# Altium footprint library Connectors.PcbLib: 43 footprints (part 2 of 3)
Each footprint in its own frame and in the unit in brackets; x right, y up, seen from the top. Pads: shape width x height; smd on the part's side, far side on the other; paste and mask are expansions set on the pad; w line width, h text height; cw(c..) or ccw(c..) is an arc to the next point about the centre after c.
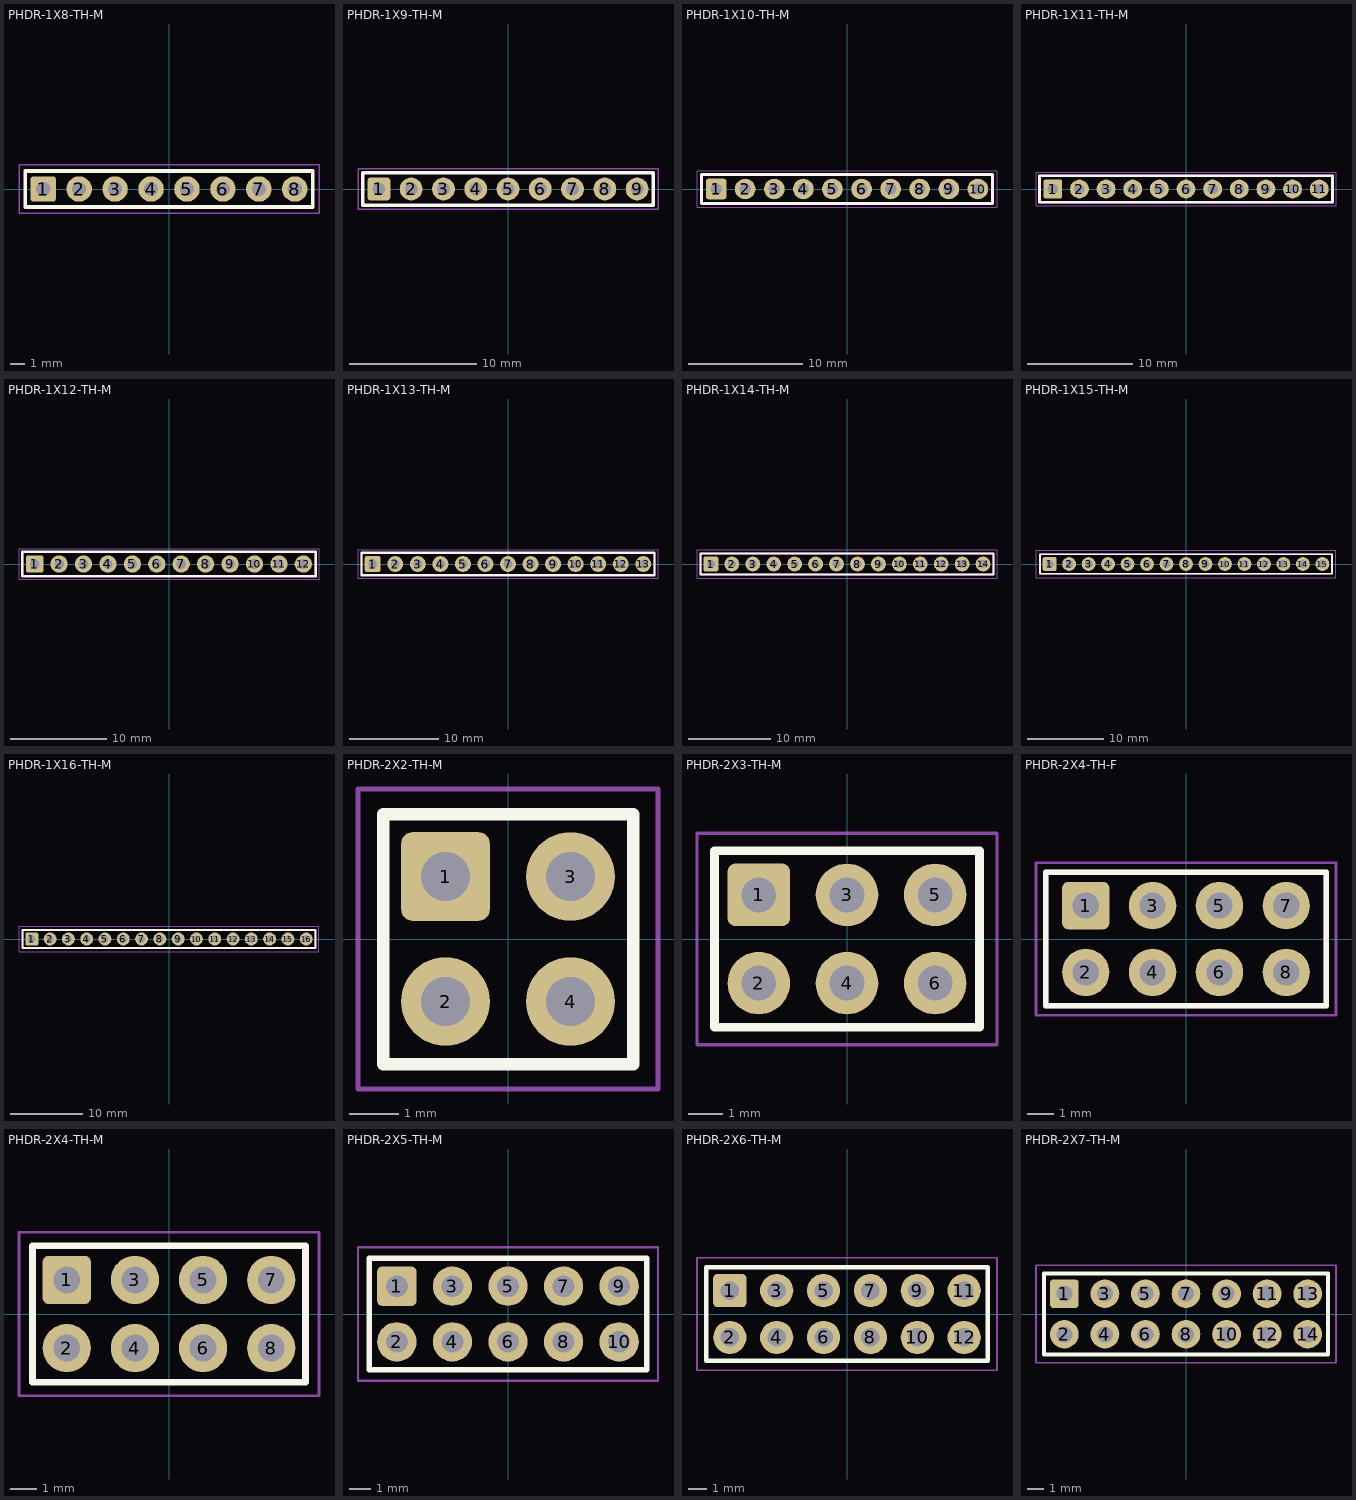
[diagram p1: the footprints below, top view; thin cyan lines are the x and y axes]

## PHDR-1X8-TH-M [mm] "Pin Header 1x8 Male TH Pitch 2.54mm"
height 9.5
pads (8):
  rrect25% 1.8x1.8 hole 1: 1(-8.89,0)
  round 1.8 hole 1: 2(-6.35,0) 3(-3.81,0) 4(-1.27,0) 5(1.27,0) 6(3.81,0) 7(6.35,0) 8(8.89,0)
Top Overlay:
  lines w0.254: -7.62,1.27 -10.16,1.27 ; -10.16,1.27 -10.16,-1.27 10.16,-1.27 10.16,1.27 -10.16,1.27
Top Assembly:
  circle w0.5: c-8.89,0 r0.15
  lines w0.2: -10.16,-1.27 10.16,-1.27 10.16,1.27 -10.16,1.27 -10.16,-1.27
Top Courtyard:
  lines w0.1: -10.6,-1.7 10.6,-1.7 10.6,1.7 -10.6,1.7 -10.6,-1.7
Top Designator:
  text ".Designator" at -7.498,-0.5 h1.5
3D body "Pin Header 1x8 TH Pitch 2.54mm.stp": height 9.5, standoff -3.2, extent -10.16,-1.27 10.16,1.27

## PHDR-1X9-TH-M [mm] "Pin Header 1x9 Male TH Pitch 2.54mm"
height 9.5
pads (9):
  rrect25% 1.8x1.8 hole 1: 1(-10.16,0)
  round 1.8 hole 1: 2(-7.62,0) 3(-5.08,0) 4(-2.54,0) 5(0,0) 6(2.54,0) 7(5.08,0) 8(7.62,0) 9(10.16,0)
Top Overlay:
  lines w0.254: -8.89,1.27 -11.43,1.27 ; -11.43,1.27 -11.43,-1.27 11.43,-1.27 11.43,1.27 -11.43,1.27
Top Assembly:
  circle w0.5: c-10.16,0 r0.15
  lines w0.2: -11.43,-1.27 -11.43,1.27 11.43,1.27 11.43,-1.27 -11.43,-1.27
Top Courtyard:
  lines w0.1: -11.8,-1.6 -11.8,1.6 11.8,1.6 11.8,-1.6 -11.8,-1.6
Top Designator:
  text ".Designator" at -7.498,-0.5 h1.5
3D body "Pin Header 1x9 TH Pitch 2.54mm.stp": height 9.5, standoff -3.2, extent -11.43,-1.27 11.43,1.27

## PHDR-1X10-TH-M [mm] "Pin Header 1x10 Male TH Pitch 2.54mm"
height 9.5
pads (10):
  rrect25% 1.8x1.8 hole 1: 1(-11.43,0)
  round 1.8 hole 1: 2(-8.89,0) 3(-6.35,0) 4(-3.81,0) 5(-1.27,0) 6(1.27,0) 7(3.81,0) 8(6.35,0) 9(8.89,0) 10(11.43,0)
Top Overlay:
  lines w0.254: -10.16,1.27 -12.7,1.27 ; -12.7,1.27 -12.7,-1.27 12.7,-1.27 12.7,1.27 -12.7,1.27
Top Assembly:
  circle w0.5: c-11.43,0 r0.15
  lines w0.2: -12.7,-1.27 12.7,-1.27 12.7,1.27 -12.7,1.27 -12.7,-1.27
Top Courtyard:
  lines w0.1: -13.1,-1.6 -13.1,1.6 13.1,1.6 13.1,-1.6 -13.1,-1.6
Top Designator:
  text ".Designator" at -7.498,-0.5 h1.5
3D body "Pin Header 1x10 TH Pitch 2.54mm.stp": height 9.5, standoff -3.2, extent -12.7,-1.27 12.7,1.27

## PHDR-1X11-TH-M [mm] "Pin Header 1x11 Male TH Pitch 2.54mm"
height 9.5
pads (11):
  rrect25% 1.8x1.8 hole 1: 1(-12.7,0)
  round 1.8 hole 1: 2(-10.16,0) 3(-7.62,0) 4(-5.08,0) 5(-2.54,0) 6(0,0) 7(2.54,0) 8(5.08,0) 9(7.62,0) 10(10.16,0) 11(12.7,0)
Top Overlay:
  lines w0.254: -11.43,1.27 -13.97,1.27 ; -13.97,1.27 13.97,1.27 13.97,-1.27 -13.97,-1.27 -13.97,1.27
Top Assembly:
  circle w0.5: c-12.7,0 r0.15
  lines w0.2: -13.97,-1.27 -13.97,1.27 13.97,1.27 13.97,-1.27 -13.97,-1.27
Top Courtyard:
  lines w0.1: -14.3,-1.6 14.3,-1.6 14.3,1.6 -14.3,1.6 -14.3,-1.6
Top Designator:
  text ".Designator" at -7.498,-0.5 h1.5
3D body "Pin Header 1x11 TH Pitch 2.54mm.stp": height 9.5, standoff -3.2, extent -13.97,-1.27 13.97,1.27

## PHDR-1X12-TH-M [mm] "Pin Header 1x12 Male TH Pitch 2.54mm"
height 9.5
pads (12):
  rrect25% 1.8x1.8 hole 1: 1(-13.97,0)
  round 1.8 hole 1: 2(-11.43,0) 3(-8.89,0) 4(-6.35,0) 5(-3.81,0) 6(-1.27,0) 7(1.27,0) 8(3.81,0) 9(6.35,0) 10(8.89,0) 11(11.43,0) 12(13.97,0)
Top Overlay:
  lines w0.254: -12.7,1.27 -15.24,1.27 ; -15.24,1.27 15.24,1.27 15.24,-1.27 -15.24,-1.27 -15.24,1.27
Top Assembly:
  circle w0.5: c-13.97,0 r0.15
  lines w0.2: -15.24,-1.27 15.24,-1.27 15.24,1.27 -15.24,1.27 -15.24,-1.27
Top Courtyard:
  lines w0.1: -15.6,-1.6 15.6,-1.6 15.6,1.6 -15.6,1.6 -15.6,-1.6
Top Designator:
  text ".Designator" at -7.498,-0.5 h1.5
3D body "Pin Header 1x12 TH Pitch 2.54mm.stp": height 9.5, standoff -3.2, extent -15.24,-1.27 15.24,1.27

## PHDR-1X13-TH-M [mm] "Pin Header 1x13 Male TH Pitch 2.54mm"
height 9.5
pads (13):
  rrect25% 1.8x1.8 hole 1: 1(-15.24,0)
  round 1.8 hole 1: 2(-12.7,0) 3(-10.16,0) 4(-7.62,0) 5(-5.08,0) 6(-2.54,0) 7(0,0) 8(2.54,0) 9(5.08,0) 10(7.62,0) 11(10.16,0) 12(12.7,0) 13(15.24,0)
Top Overlay:
  lines w0.254: -13.97,1.27 -16.51,1.27 ; -16.51,1.27 16.51,1.27 16.51,-1.27 -16.51,-1.27 -16.51,1.27
Top Assembly:
  circle w0.5: c-15.24,0 r0.15
  lines w0.2: -16.51,-1.27 16.51,-1.27 16.51,1.27 -16.51,1.27 -16.51,-1.27
Top Courtyard:
  lines w0.1: -16.9,-1.6 -16.9,1.6 16.9,1.6 16.9,-1.6 -16.9,-1.6
Top Designator:
  text ".Designator" at -7.498,-0.5 h1.5
3D body "Pin Header 1x13 TH Pitch 2.54mm.stp": height 9.5, standoff -3.2, extent -16.51,-1.27 16.51,1.27

## PHDR-1X14-TH-M [mm] "Pin Header 1x14 Male TH Pitch 2.54mm"
height 9.5
pads (14):
  rrect25% 1.8x1.8 hole 1: 1(-16.51,0)
  round 1.8 hole 1: 2(-13.97,0) 3(-11.43,0) 4(-8.89,0) 5(-6.35,0) 6(-3.81,0) 7(-1.27,0) 8(1.27,0) 9(3.81,0) 10(6.35,0) 11(8.89,0) 12(11.43,0) 13(13.97,0) 14(16.51,0)
Top Overlay:
  lines w0.254: -15.24,1.27 -17.78,1.27 ; -17.78,1.27 -17.78,-1.27 17.78,-1.27 17.78,1.27 -17.78,1.27
Top Assembly:
  circle w0.5: c-16.51,0 r0.15
  lines w0.2: -17.78,-1.27 -17.78,1.27 17.78,1.27 17.78,-1.27 -17.78,-1.27
Top Courtyard:
  lines w0.1: -18.2,-1.7 -18.2,1.7 18.2,1.7 18.2,-1.7 -18.2,-1.7
Top Designator:
  text ".Designator" at -7.498,-0.5 h1.5
3D body "Pin Header 1x14 TH Pitch 2.54mm.stp": height 9.5, standoff -3.2, extent -17.78,-1.27 17.78,1.27

## PHDR-1X15-TH-M [mm] "Pin Header 1x15 Male TH Pitch 2.54mm"
height 9.5
pads (15):
  rrect25% 1.8x1.8 hole 1: 1(-17.78,0)
  round 1.8 hole 1: 2(-15.24,0) 3(-12.7,0) 4(-10.16,0) 5(-7.62,0) 6(-5.08,0) 7(-2.54,0) 8(0,0) 9(2.54,0) 10(5.08,0) 11(7.62,0) 12(10.16,0) 13(12.7,0) 14(15.24,0) 15(17.78,0)
Top Overlay:
  lines w0.254: -16.51,1.27 -19.05,1.27 ; -19.05,1.27 -19.05,-1.27 19.05,-1.27 19.05,1.27 -19.05,1.27
Top Assembly:
  circle w0.5: c-17.78,0 r0.15
  lines w0.2: -19.05,-1.27 -19.05,1.27 19.05,1.27 19.05,-1.27 -19.05,-1.27
Top Courtyard:
  lines w0.1: -19.558,-1.778 -19.558,1.778 19.558,1.778 19.558,-1.778 -19.558,-1.778
Top Designator:
  text ".Designator" at -7.498,-0.5 h1.5
3D body "Pin Header 1x15 TH Pitch 2.54mm.stp": height 9.5, standoff -3.2, extent -19.05,-1.27 19.05,1.27

## PHDR-1X16-TH-M [mm] "Pin Header 1x16 Male TH Pitch 2.54mm"
height 9.5
pads (16):
  rrect25% 1.8x1.8 hole 1: 1(-19.05,0)
  round 1.8 hole 1: 2(-16.51,0) 3(-13.97,0) 4(-11.43,0) 5(-8.89,0) 6(-6.35,0) 7(-3.81,0) 8(-1.27,0) 9(1.27,0) 10(3.81,0) 11(6.35,0) 12(8.89,0) 13(11.43,0) 14(13.97,0) 15(16.51,0) 16(19.05,0)
Top Overlay:
  lines w0.254: -17.78,1.27 -20.32,1.27 ; -20.32,1.27 -20.32,-1.27 20.32,-1.27 20.32,1.27 -20.32,1.27
Top Assembly:
  circle w0.5: c-19.05,0 r0.15
  lines w0.2: -20.32,-1.27 20.32,-1.27 20.32,1.27 -20.32,1.27 -20.32,-1.27
Top Courtyard:
  lines w0.1: -20.828,-1.778 -20.828,1.778 20.828,1.778 20.828,-1.778 -20.828,-1.778
Top Designator:
  text ".Designator" at -7.498,-0.5 h1.5
3D body "Pin Header 1x16 TH Pitch 2.54mm.stp": height 9.5, standoff -3.2, extent -20.32,-1.27 20.32,1.27

## PHDR-2X2-TH-M [mm] "PinHeader 2x2 TH Pitch 2.54mm"
height 9.5
pads (4):
  rrect25% 1.8x1.8 hole 1: 1(-1.27,1.27)
  round 1.8 hole 1: 2(-1.27,-1.27) 3(1.27,1.27) 4(1.27,-1.27)
Top Overlay:
  lines w0.254: 0,2.54 -2.54,2.54 ; -2.54,2.54 -2.54,0 -2.54,-2.54 2.54,-2.54 2.54,2.54 -2.54,2.54
Top Assembly:
  circle w0.5: c-1.27,1.27 r0.15
  lines w0.2: -2.54,-2.54 -2.54,2.54 2.54,2.54 2.54,-2.54 -2.54,-2.54
Top Courtyard:
  lines w0.1: -3.048,-3.048 3.048,-3.048 3.048,3.048 -3.048,3.048 -3.048,-3.048
Top Designator:
  text ".Designator" at -7.498,-0.5 h1.5
3D body "Pin Header 2x2 TH Pitch 2.54mm.stp": height 9.5, standoff -3.2, extent -2.54,-2.54 2.54,2.54

## PHDR-2X3-TH-M [mm] "PinHeader 2x3 TH Pitch 2.54mm"
height 9.5
pads (6):
  rrect25% 1.8x1.8 hole 1: 1(-2.54,1.27)
  round 1.8 hole 1: 2(-2.54,-1.27) 3(0,1.27) 4(0,-1.27) 5(2.54,1.27) 6(2.54,-1.27)
Top Overlay:
  lines w0.254: -1.27,2.54 -3.81,2.54 ; -3.81,2.54 3.81,2.54 3.81,-2.54 -3.81,-2.54 -3.81,0 -3.81,2.54
Top Assembly:
  circle w0.5: c-2.54,1.27 r0.15
  lines w0.2: -3.81,-2.54 -3.81,2.54 3.81,2.54 3.81,-2.54 -3.81,-2.54
Top Courtyard:
  lines w0.1: -4.318,-3.048 4.318,-3.048 4.318,3.048 -4.318,3.048 -4.318,-3.048
Top Designator:
  text ".Designator" at -7.498,-0.5 h1.5
3D body "Pin Header 2x3 TH Pitch 2.54mm.stp": height 9.5, standoff -3.2, extent -3.81,-2.54 3.81,2.54

## PHDR-2X4-TH-F [mm] "PinHeader female 2x4 TH Pitch 2.54mm"
height 9.5
pads (8):
  rrect25% 1.8x1.8 hole 1: 1(-3.81,1.27)
  round 1.8 hole 1: 2(-3.81,-1.27) 3(-1.27,1.27) 4(-1.27,-1.27) 5(1.27,1.27) 6(1.27,-1.27) 7(3.81,1.27) 8(3.81,-1.27)
Top Overlay:
  lines w0.2: -5.33,-2.54 -5.33,2.54 5.334,2.54 5.334,-2.54 -5.33,-2.54
Top Assembly:
  circle w0.5: c-3.81,1.27 r0.15
  lines w0.2: -5.33,-2.54 -5.33,2.54 5.334,2.54 5.334,-2.54 -5.33,-2.54
Top Courtyard:
  lines w0.1: -5.7,-2.9 -5.7,2.9 5.7,2.9 5.7,-2.9 -5.7,-2.9
Top Designator:
  text ".Designator" at -7.498,-0.5 h1.5
3D body "User Library-zl262-8d_p2-54_l10-66_w5_h8-5.step": height 8.5, standoff -3, extent -5.33,-2.5 5.33,2.5

## PHDR-2X4-TH-M [mm] "PinHeader 2x4 TH Pitch 2.54mm"
height 9.5
pads (8):
  rrect25% 1.8x1.8 hole 1: 1(-3.81,1.27)
  round 1.8 hole 1: 2(-3.81,-1.27) 3(-1.27,1.27) 4(-1.27,-1.27) 5(1.27,1.27) 6(1.27,-1.27) 7(3.81,1.27) 8(3.81,-1.27)
Top Overlay:
  lines w0.254: -2.54,2.54 -5.08,2.54 ; -5.08,2.54 5.08,2.54 5.08,0 5.08,-2.54 -5.08,-2.54 -5.08,0 -5.08,2.54
Top Assembly:
  circle w0.5: c-3.81,1.27 r0.15
  lines w0.2: -5.08,-2.54 5.08,-2.54 5.08,2.54 -5.08,2.54 -5.08,-2.54
Top Courtyard:
  lines w0.1: -5.588,-3.048 -5.588,3.048 5.588,3.048 5.588,-3.048 -5.588,-3.048
Top Designator:
  text ".Designator" at -7.498,-0.5 h1.5
3D body "Pin Header 2x4 TH Pitch 2.54mm.stp": height 9.5, standoff -3.2, extent -5.08,-2.54 5.08,2.54

## PHDR-2X5-TH-M [mm] "PinHeader 2x5 TH Pitch 2.54mm"
height 9.5
pads (10):
  rrect25% 1.8x1.8 hole 1: 1(-5.08,1.27)
  round 1.8 hole 1: 2(-5.08,-1.27) 3(-2.54,1.27) 4(-2.54,-1.27) 5(0,1.27) 6(0,-1.27) 7(2.54,1.27) 8(2.54,-1.27) 9(5.08,1.27) 10(5.08,-1.27)
Top Overlay:
  lines w0.254: -3.81,2.54 -6.35,2.54 ; -6.35,2.54 -6.35,0 -6.35,-2.54 6.35,-2.54 6.35,2.54 -6.35,2.54
Top Assembly:
  circle w0.5: c-5.08,1.27 r0.15
  lines w0.2: -6.35,-2.54 6.35,-2.54 6.35,2.54 -6.35,2.54 -6.35,-2.54
Top Courtyard:
  lines w0.1: -6.858,-3.048 6.858,-3.048 6.858,3.048 -6.858,3.048 -6.858,-3.048
Top Designator:
  text ".Designator" at -7.498,-0.5 h1.5
3D body "Pin Header 2x5 TH Pitch 2.54mm.stp": height 9.5, standoff -3.2, extent -6.35,-2.54 6.35,2.54

## PHDR-2X6-TH-M [mm] "PinHeader 2x6 TH Pitch 2.54mm"
height 9.5
pads (12):
  rrect25% 1.8x1.8 hole 1: 1(-6.35,1.27)
  round 1.8 hole 1: 2(-6.35,-1.27) 3(-3.81,1.27) 4(-3.81,-1.27) 5(-1.27,1.27) 6(-1.27,-1.27) 7(1.27,1.27) 8(1.27,-1.27) 9(3.81,1.27) 10(3.81,-1.27) 11(6.35,1.27) 12(6.35,-1.27)
Top Overlay:
  lines w0.254: -5.08,2.54 -7.62,2.54 ; -7.62,2.54 -7.62,0 -7.62,-2.54 7.62,-2.54 7.62,2.54 -7.62,2.54
Top Assembly:
  circle w0.5: c-6.35,1.27 r0.15
  lines w0.2: -7.62,-2.54 -7.62,2.54 7.62,2.54 7.62,-2.54 -7.62,-2.54
Top Courtyard:
  lines w0.1: -8.128,-3.048 8.128,-3.048 8.128,3.048 -8.128,3.048 -8.128,-3.048
Top Designator:
  text ".Designator" at -7.498,-0.5 h1.5
3D body "Pin Header 2x6 TH Pitch 2.54mm.stp": height 9.5, standoff -3.2, extent -7.62,-2.54 7.62,2.54

## PHDR-2X7-TH-M [mm] "PinHeader 2x7 TH Pitch 2.54mm"
height 9.5
pads (14):
  rrect25% 1.8x1.8 hole 1: 1(-7.62,1.27)
  round 1.8 hole 1: 2(-7.62,-1.27) 3(-5.08,1.27) 4(-5.08,-1.27) 5(-2.54,1.27) 6(-2.54,-1.27) 7(0,1.27) 8(0,-1.27) 9(2.54,1.27) 10(2.54,-1.27) 11(5.08,1.27) 12(5.08,-1.27) 13(7.62,1.27) 14(7.62,-1.27)
Top Overlay:
  lines w0.254: -6.35,2.54 -8.89,2.54 ; -8.89,2.54 -8.89,0 -8.89,-2.54 8.89,-2.54 8.89,2.54 -8.89,2.54
Top Assembly:
  circle w0.5: c-7.62,1.27 r0.15
  lines w0.2: -8.89,-2.54 8.89,-2.54 8.89,2.54 -8.89,2.54 -8.89,-2.54
Top Courtyard:
  lines w0.1: -9.398,-3.048 -9.398,3.048 9.398,3.048 9.398,-3.048 -9.398,-3.048
Top Designator:
  text ".Designator" at -7.498,-0.5 h1.5
3D body "Pin Header 2x7 TH Pitch 2.54mm.stp": height 9.5, standoff -3.2, extent -8.89,-2.54 8.89,2.54